# Altium footprint library mobinbyn-Module.PcbLib: 93 footprints (part 3 of 6)
Each footprint in its own frame and in the unit in brackets; x right, y up, seen from the top. Pads: shape width x height; smd on the part's side, far side on the other; paste and mask are expansions set on the pad; w line width, h text height; cw(c..) or ccw(c..) is an arc to the next point about the centre after c.
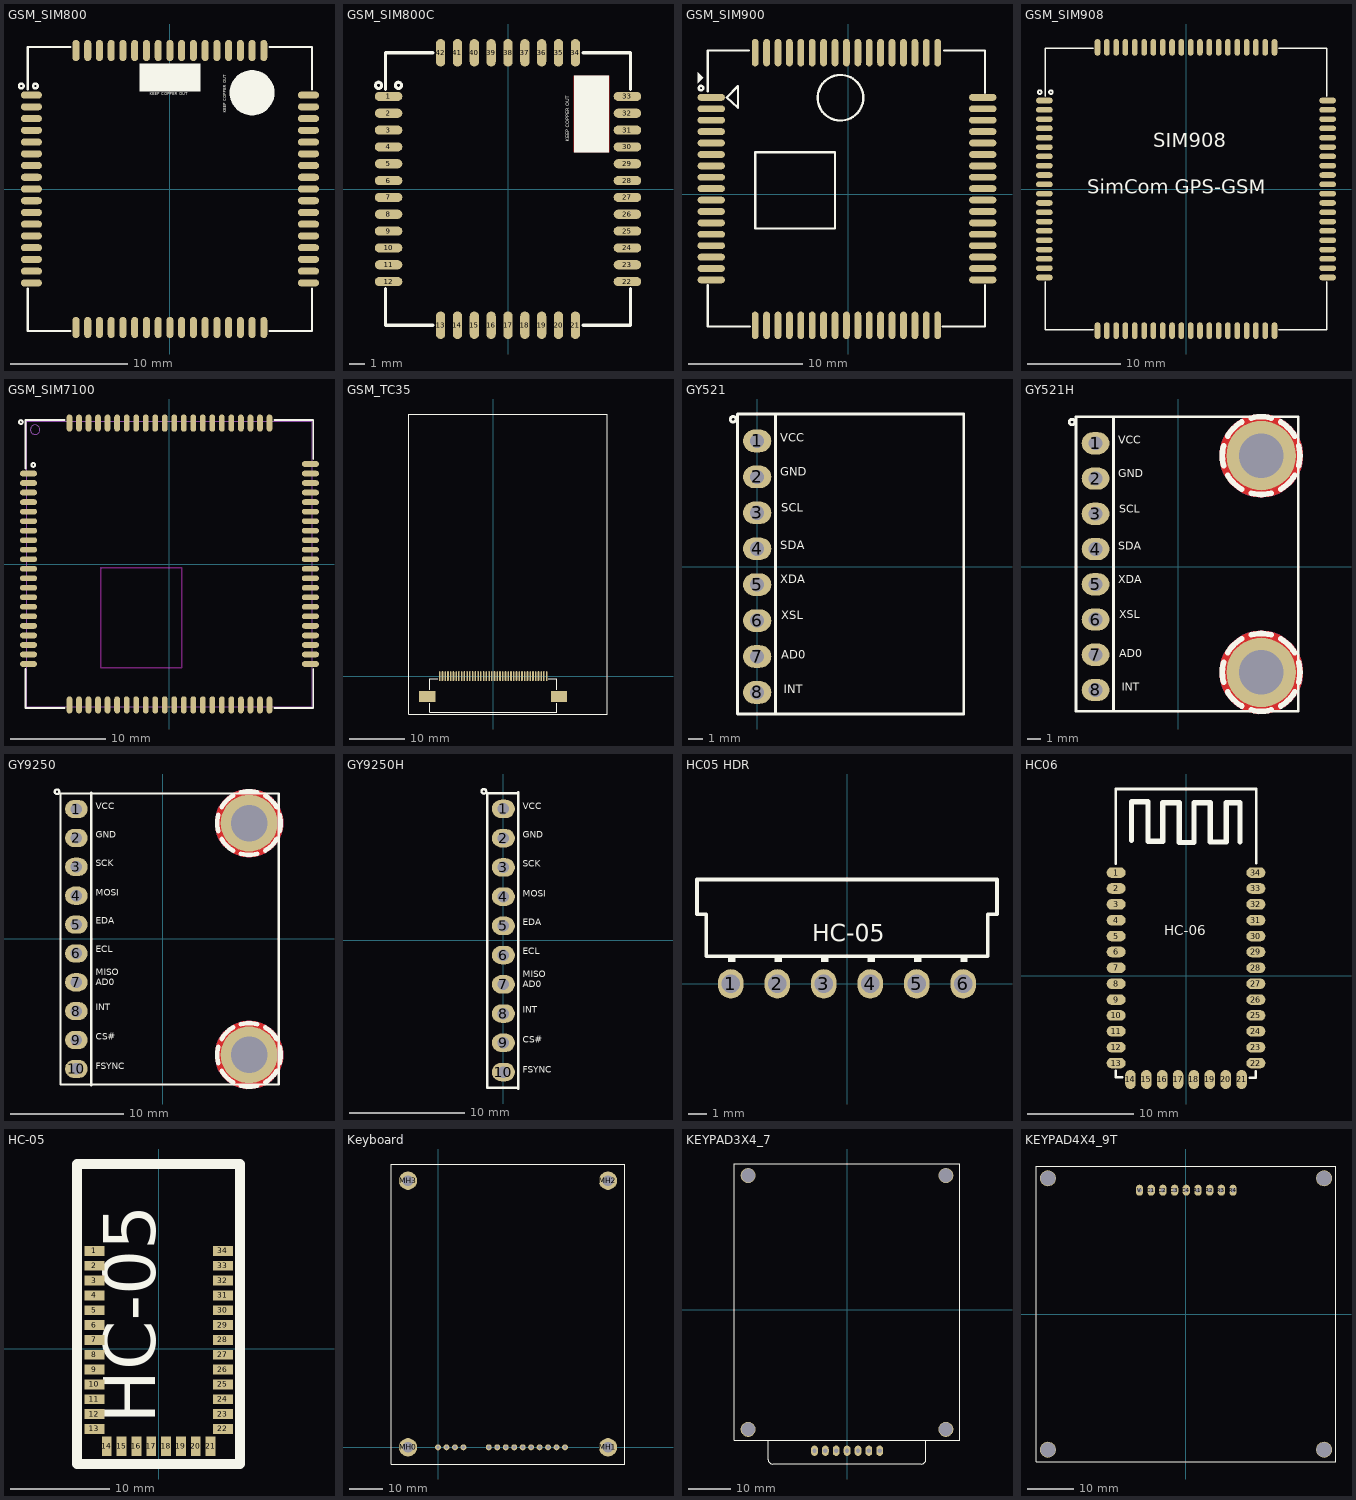
[diagram p2: the footprints below, top view; thin cyan lines are the x and y axes]

## GSM_SIM800 [mm]
pads (68):
  oval 1.8x0.6 smd: 1(-11.8,8) 2(-11.8,7) 3(-11.8,6) 4(-11.8,5) 5(-11.8,4) 6(-11.8,3) 7(-11.8,2) 8(-11.8,1) 9(-11.8,0) 10(-11.8,-1) 11(-11.8,-2) 12(-11.8,-3) 13(-11.8,-4) 14(-11.8,-5) 15(-11.8,-6) 16(-11.8,-7) 17(-11.8,-8) 35(11.8,-8) 36(11.8,-7) 37(11.8,-6) 38(11.8,-5) 39(11.8,-4) 40(11.8,-3) 41(11.8,-2) 42(11.8,-1) 43(11.8,0) 44(11.8,1) 45(11.8,2) 46(11.8,3) 47(11.8,4) 48(11.8,5) 49(11.8,6) 50(11.8,7) 51(11.8,8)
  oval 0.6x1.8 smd: 18(-8,-11.8) 19(-7,-11.8) 20(-6,-11.8) 21(-5,-11.8) 22(-4,-11.8) 23(-3,-11.8) 24(-2,-11.8) 25(-1,-11.8) 26(0,-11.8) 27(1,-11.8) 28(2,-11.8) 29(3,-11.8) 30(4,-11.8) 31(5,-11.8) 32(6,-11.8) 33(7,-11.8) 34(8,-11.8) 52(8,11.8) 53(7,11.8) 54(6,11.8) 55(5,11.8) 56(4,11.8) 57(3,11.8) 58(2,11.8) 59(1,11.8) 60(0,11.8) 61(-1,11.8) 62(-2,11.8) 63(-3,11.8) 64(-4,11.8) 65(-5,11.8) 66(-6,11.8) 67(-7,11.8) 68(-8,11.8)
Top Overlay:
  circle w0.2: c-11.455,8.774 r0.2
  circle w0.2: c-12.655,8.774 r0.2
  rectangle: -2.6,8.3 2.6,10.7
  region: 5.1,8.2 5.1,8.387 5.173,8.754 5.316,9.1 5.524,9.411 5.789,9.676 6.1,9.884 6.446,10.027 6.813,10.1 7,10.1 7.187,10.1 7.554,10.027 7.9,9.884 8.211,9.676 8.476,9.411 8.684,9.1 8.827,8.754 8.9,8.387 8.9,8.2 8.9,8.013 8.827,7.646 8.684,7.3 8.476,6.989 8.211,6.724 7.9,6.516 7.554,6.373 7.187,6.3 7,6.3 6.813,6.3 6.446,6.373 6.1,6.516 5.789,6.724 5.524,6.989 5.316,7.3 5.173,7.646 5.1,8.013
  lines w0.2: -12.1,-8.5 -12.1,-12.1 -8.5,-12.1 ; -12.1,8.5 -12.1,12.1 -8.5,12.1 ; 8.5,-12.1 12.1,-12.1 12.1,-8.5 ; 8.5,12.1 12.1,12.1 12.1,8.5
  text "KEEP COPPER OUT" at 4.9,6.5 h0.4
  text "KEEP COPPER OUT" at -1.7,7.9 h0.4
3D body "User Library-SIM800.step": height 3.1, standoff 0.1, extent -12,-12 12,12

## GSM_SIM800C [mm] "GSM, SIM800C, 42-L, 15.7X17.6mm"
pads (42):
  oval 1.8x0.6 smd: 1(-7.8,6.05) 2(-7.8,4.95) 3(-7.8,3.85) 4(-7.8,2.75) 5(-7.8,1.65) 6(-7.8,0.55) 7(-7.8,-0.55) 8(-7.8,-1.65) 9(-7.8,-2.75) 10(-7.8,-3.85) 11(-7.8,-4.95) 12(-7.8,-6.05) 22(7.8,-6.05) 23(7.8,-4.95) 24(7.8,-3.85) 25(7.8,-2.75) 26(7.8,-1.65) 27(7.8,-0.55) 28(7.8,0.55) 29(7.8,1.65) 30(7.8,2.75) 31(7.8,3.85) 32(7.8,4.95) 33(7.8,6.05)
  oval 0.6x1.8 smd: 13(-4.4,-8.9) 14(-3.3,-8.9) 15(-2.2,-8.9) 16(-1.1,-8.9) 17(0,-8.9) 18(1.1,-8.9) 19(2.2,-8.9) 20(3.3,-8.9) 21(4.4,-8.9) 34(4.4,8.9) 35(3.3,8.9) 36(2.2,8.9) 37(1.1,8.9) 38(0,8.9) 39(-1.1,8.9) 40(-2.2,8.9) 41(-3.3,8.9) 42(-4.4,8.9)
Top Layer:
  pour cut-out: 6.6,7.4 4.3,7.4 4.3,2.4 6.6,2.4
Top Overlay:
  circle w0.2: c-7.155,6.774 r0.2
  circle w0.2: c-8.455,6.774 r0.2
  rectangle: 4.3,2.4 6.6,7.4
  lines w0.2: -8,-6.5 -8,-8.9 -4.9,-8.9 ; -8,6.5 -8,8.9 -4.9,8.9 ; 4.9,-8.9 8,-8.9 8,-6.5 ; 4.9,8.9 8,8.9 8,6.5
  text "KEEP COPPER OUT" at 4.1,3.1 h0.4
3D body "SIM800C-1.STEP": height 2.37, standoff 0.03, extent -7.849,-8.812 7.851,8.788

## GSM_SIM900 [mm] "SIM900_SIM900A"
pads (68):
  oval 2.4x0.6 smd mask+0.1: 1(-12,8.48) 2(-12,7.48) 3(-12,6.48) 4(-12,5.48) 5(-12,4.48) 6(-12,3.48) 7(-12,2.48) 8(-12,1.48) 9(-12,0.48) 10(-12,-0.52) 11(-12,-1.52) 12(-12,-2.52) 13(-12,-3.52) 14(-12,-4.52) 15(-12,-5.52) 16(-12,-6.52) 17(-12,-7.52) 35(11.8,-7.52) 36(11.8,-6.52) 37(11.8,-5.52) 38(11.8,-4.52) 39(11.8,-3.52) 40(11.8,-2.52) 41(11.8,-1.52) 42(11.8,-0.52) 43(11.8,0.48) 44(11.8,1.48) 45(11.8,2.48) 46(11.8,3.48) 47(11.8,4.48) 48(11.8,5.48) 49(11.8,6.48) 50(11.8,7.48) 51(11.8,8.48)
  oval 0.6x2.4 smd mask+0.1: 18(-8.15,-11.5) 19(-7.15,-11.5) 20(-6.15,-11.5) 21(-5.15,-11.5) 22(-4.15,-11.5) 23(-3.15,-11.5) 24(-2.15,-11.5) 25(-1.15,-11.5) 26(-0.15,-11.5) 27(0.85,-11.5) 28(1.85,-11.5) 29(2.85,-11.5) 30(3.85,-11.5) 31(4.85,-11.5) 32(5.85,-11.5) 33(6.85,-11.5) 34(7.85,-11.5) 52(7.85,12.4) 53(6.85,12.4) 54(5.85,12.4) 55(4.85,12.4) 56(3.85,12.4) 57(2.85,12.4) 58(1.85,12.4) 59(0.85,12.4) 60(-0.15,12.4) 61(-1.15,12.4) 62(-2.15,12.4) 63(-3.15,12.4) 64(-4.15,12.4) 65(-5.15,12.4) 66(-6.15,12.4) 67(-7.15,12.4) 68(-8.15,12.4)
Top Overlay:
  circle w0.2: c-12.9,9.3 r0.2
  circle w0.2: c-0.67,8.45 r2
  region: -13.2,9.7 -13.2,10.7 -12.7,10.2
  lines w0.2: -12.3,-8 -12.3,-11.6 -8.6,-11.6 ; -12.3,9 -12.3,12.6 -8.7,12.6 ; 8.3,-11.6 12,-11.6 12,-8 ; 8.4,12.6 12,12.6 12,8.9 ; -10.65,8.48 -9.65,9.48 -9.65,7.58 -10.65,8.48 ; -8.15,-3.02 -1.15,-3.02 -1.15,3.68 -8.15,3.68 -8.15,-3.02
3D body "GSM_SIM900.STEP": height 3, standoff 0, extent -12.15,-11.5 11.85,12.5

## GSM_SIM908 [mm] "SimCom Sim908 GPS/GSM"
pads (80):
  oval 1.8x0.6 smd: 1(-15.2,9.5) 2(-15.2,8.5) 3(-15.2,7.5) 4(-15.2,6.5) 5(-15.2,5.5) 6(-15.2,4.5) 7(-15.2,3.5) 8(-15.2,2.5) 9(-15.2,1.5) 10(-15.2,0.5) 11(-15.2,-0.5) 12(-15.2,-1.5) 13(-15.2,-2.5) 14(-15.2,-3.5) 15(-15.2,-4.5) 16(-15.2,-5.5) 17(-15.2,-6.5) 18(-15.2,-7.5) 19(-15.2,-8.5) 20(-15.2,-9.5) 41(15.2,-9.5) 42(15.2,-8.5) 43(15.2,-7.5) 44(15.2,-6.5) 45(15.2,-5.5) 46(15.2,-4.5) 47(15.2,-3.5) 48(15.2,-2.5) 49(15.2,-1.5) 50(15.2,-0.5) 51(15.2,0.5) 52(15.2,1.5) 53(15.2,2.5) 54(15.2,3.5) 55(15.2,4.5) 56(15.2,5.5) 57(15.2,6.5) 58(15.2,7.5) 59(15.2,8.5) 60(15.2,9.5)
  oval 0.6x1.8 smd: 21(-9.5,-15.2) 22(-8.5,-15.2) 23(-7.5,-15.2) 24(-6.5,-15.2) 25(-5.5,-15.2) 26(-4.5,-15.2) 27(-3.5,-15.2) 28(-2.5,-15.2) 29(-1.5,-15.2) 30(-0.5,-15.2) 31(0.5,-15.2) 32(1.5,-15.2) 33(2.5,-15.2) 34(3.5,-15.2) 35(4.5,-15.2) 36(5.5,-15.2) 37(6.5,-15.2) 38(7.5,-15.2) 39(8.5,-15.2) 40(9.5,-15.2) 61(9.5,15.2) 62(8.5,15.2) 63(7.5,15.2) 64(6.5,15.2) 65(5.5,15.2) 66(4.5,15.2) 67(3.5,15.2) 68(2.5,15.2) 69(1.5,15.2) 70(0.5,15.2) 71(-0.5,15.2) 72(-1.5,15.2) 73(-2.5,15.2) 74(-3.5,15.2) 75(-4.5,15.2) 76(-5.5,15.2) 77(-6.5,15.2) 78(-7.5,15.2) 79(-8.5,15.2) 80(-9.5,15.2)
Top Overlay:
  circle w0.2: c-15.7,10.4 r0.2
  circle w0.2: c-14.5,10.4 r0.2
  lines w0.2: -15.1,-10 -15.1,-15.1 -10,-15.1 ; -15.1,10 -15.1,15.1 -10,15.1 ; 10,-15.1 15.1,-15.1 15.1,-10 ; 10,15.1 15.1,15.1 15.1,10
  text "SIM908" at -3.5,4.5 h1.52
  text "SimCom GPS-GSM" at -10.576,-0.5 h1.52
3D body "User Library-SIM908.STEP": height 3.39, standoff 0.19, extent -15,-15 15,15

## GSM_SIM7100 [mm] "SIM7100 SIM5360 87-lead pitch:1mm 30x30mm"
height 2.9
pads (87):
  oval 1.8x0.6 smd mask+0.075: 1(-14.8,9.5) 2(-14.8,8.5) 3(-14.8,7.5) 4(-14.8,6.5) 5(-14.8,5.5) 6(-14.8,4.5) 7(-14.8,3.5) 8(-14.8,2.5) 9(-14.8,1.5) 10(-14.8,0.5) 11(-14.8,-0.5) 12(-14.8,-1.5) 13(-14.8,-2.5) 14(-14.8,-3.5) 15(-14.8,-4.5) 16(-14.8,-5.5) 17(-14.8,-6.5) 18(-14.8,-7.5) 19(-14.8,-8.5) 20(-14.8,-9.5) 41(14.8,-9.5) 42(14.8,-8.5) 43(14.8,-7.5) 44(14.8,-6.5) 45(14.8,-5.5) 46(14.8,-4.5) 47(14.8,-3.5) 48(14.8,-2.5) 49(14.8,-1.5) 50(14.8,-0.5) 51(14.8,0.5) 52(14.8,1.5) 53(14.8,2.5) 54(14.8,3.5) 55(14.8,4.5) 56(14.8,5.5) 57(14.8,6.5) 58(14.8,7.5) 59(14.8,8.5) 60(14.8,9.5) 81(-14.8,-10.5) 82(14.8,-10.5) 85(14.8,10.5)
  oval 0.6x1.8 smd mask+0.075: 21(-9.5,-14.8) 22(-8.5,-14.8) 23(-7.5,-14.8) 24(-6.5,-14.8) 25(-5.5,-14.8) 26(-4.5,-14.8) 27(-3.5,-14.8) 28(-2.5,-14.8) 29(-1.5,-14.8) 30(-0.5,-14.8) 31(0.5,-14.8) 32(1.5,-14.8) 33(2.5,-14.8) 34(3.5,-14.8) 35(4.5,-14.8) 36(5.5,-14.8) 37(6.5,-14.8) 38(7.5,-14.8) 39(8.5,-14.8) 40(9.5,-14.8) 61(9.5,14.8) 62(8.5,14.8) 63(7.5,14.8) 64(6.5,14.8) 65(5.5,14.8) 66(4.5,14.8) 67(3.5,14.8) 68(2.5,14.8) 69(1.5,14.8) 70(0.5,14.8) 71(-0.5,14.8) 72(-1.5,14.8) 73(-2.5,14.8) 74(-3.5,14.8) 75(-4.5,14.8) 76(-5.5,14.8) 77(-6.5,14.8) 78(-7.5,14.8) 79(-8.5,14.8) 80(-9.5,14.8) 83(10.5,-14.8) 84(-10.5,-14.8) 86(-10.5,14.8) 87(10.5,14.8)
Top Overlay:
  circle w0.2: c-15.6,14.9 r0.2
  circle w0.2: c-14.3,10.4 r0.2
  lines w0.2: -15.1,-11 -15.1,-15.1 -11,-15.1 ; -15.1,10 -15.1,15.1 -11,15.1 ; 11,-15.1 15.1,-15.1 15.1,-11 ; 11,15.1 15.1,15.1 15.1,11
Keep-Out Layer:
  lines w0.15: -7.2,-10.9 1.3,-10.9 1.3,-0.4 -7.2,-0.4 -7.2,-10.9
Mechanical 13:
  circle w0.1: c-14.1,14.1 r0.5
  lines w0.1: -15,-15 15,-15 15,15 -15,15 -15,-15
3D body "User Library-SIM7100C.step": height 3.17, standoff 0, extent -15,-15 15,15

## GSM_TC35 [mm]
pads (42):
  oval 0.3x1.8 smd mask+0.05: 1(9.75,0) 2(9.25,0) 3(8.75,0) 4(8.25,0) 5(7.75,0) 6(7.25,0) 7(6.75,0) 8(6.25,0) 9(5.75,0) 10(5.25,0) 11(4.75,0) 12(4.25,0) 13(3.75,0) 14(3.25,0) 15(2.75,0) 16(2.25,0) 17(1.75,0) 18(1.25,0) 19(0.75,0) 20(0.25,0) 21(-0.25,0) 22(-0.75,0) 23(-1.25,0) 24(-1.75,0) 25(-2.25,0) 26(-2.75,0) 27(-3.25,0) 28(-3.75,0) 29(-4.25,0) 30(-4.75,0) 31(-5.25,0) 32(-5.75,0) 33(-6.25,0) 34(-6.75,0) 35(-7.25,0) 36(-7.75,0) 37(-8.25,0) 38(-8.75,0) 39(-9.25,0) 40(-9.75,0)
  rrect0% 3x2 smd: ""(-12,-3.7) ""(12,-3.7)
Top Overlay:
  lines w0.2: -11.6,-4.9 -11.6,-6.6 11.55,-6.6 ; -11.6,-2.5 -11.6,-0.5 -10.074,-0.5 ; 10.074,-0.5 11.6,-0.5 11.6,-2.5 ; 11.6,-6.6 11.6,-4.9 ; -15.4,-6.9 20.8,-6.9 20.8,47.8 -15.4,47.8 -15.4,-6.9
3D body: height 3, standoff 0.1, extent -11.5,-6.6 11.55,-0.6
3D body "User Library-siemens tc35i module.STEP": height 5.55, standoff 2, extent -15.264,-6.772 20.736,47.728

## GY521 [mm] "GY-521, MPU-6050 Module"
pads (8):
  oval 2x1.6 hole 1 mask+0.1: 1(0,8.89) 2(0,6.35) 3(0,3.81) 4(0,1.27) 5(0,-1.27) 6(0,-3.81) 7(0,-6.35) 8(0,-8.89)
Top Overlay:
  circle w0.2: c-1.7,10.42 r0.2
  lines w0.2: 1.3,-10.414 1.3,10.795 ; -1.4,-10.414 14.605,-10.414 14.605,10.795 -1.4,10.795 -1.4,-10.414
  text "VCC" at 1.651,8.636 h1
  text "SCL" at 1.706,3.683 h1
  text "SDA" at 1.645,1.016 h1
  text "XDA" at 1.63,-1.397 h1
  text "XSL" at 1.715,-3.937 h1
  text "AD0" at 1.7,-6.731 h1
  text "INT" at 1.891,-9.144 h1
  text "GND" at 1.622,6.223 h1
3D body "MPU-6050 IMU-GY-521.STEP": height 8.94, standoff -2.23, extent -1.27,-10.367 14.605,10.741

## GY521H [mm] "GY-521, MPU-6050 Module"
pads (10):
  oval 2x1.6 hole 1 mask+0.1: 1(-5.969,8.89) 2(-5.969,6.35) 3(-5.969,3.81) 4(-5.969,1.27) 5(-5.969,-1.27) 6(-5.969,-3.81) 7(-5.969,-6.35) 8(-5.969,-8.89)
  round 5 / inner round 3.5 / far side round 5 hole 3.2 mask+0.1: ""(5.969,-7.62) ""(5.969,8.001)
Top Layer:
  pour cut-out: 5.969,11.001 5.772,11.001 5.382,10.95 5.003,10.848 4.639,10.697 4.299,10.501 3.987,10.261 3.709,9.983 3.469,9.671 3.273,9.331 3.122,8.967 3.02,8.588 2.969,8.198 2.969,8.001 2.969,7.804 3.02,7.414 3.122,7.035 3.273,6.671 3.469,6.331 3.709,6.019 3.987,5.741 4.299,5.501 4.639,5.305 5.003,5.154 5.382,5.052 5.772,5.001 5.969,5.001 6.166,5.001 6.556,5.052 6.935,5.154 7.299,5.305 7.639,5.501 7.951,5.741 8.229,6.019 8.469,6.331 8.665,6.671 8.816,7.035 8.918,7.414 8.969,7.804 8.969,8.001 8.969,8.198 8.918,8.588 8.816,8.967 8.665,9.331 8.469,9.671 8.229,9.983 7.951,10.261 7.639,10.501 7.299,10.697 6.935,10.848 6.556,10.95 6.166,11.001
  pour cut-out: 5.969,-4.62 5.772,-4.62 5.382,-4.671 5.003,-4.773 4.639,-4.924 4.299,-5.12 3.987,-5.36 3.709,-5.638 3.469,-5.95 3.273,-6.29 3.122,-6.654 3.02,-7.033 2.969,-7.423 2.969,-7.62 2.969,-7.817 3.02,-8.207 3.122,-8.586 3.273,-8.95 3.469,-9.29 3.709,-9.602 3.987,-9.88 4.299,-10.12 4.639,-10.316 5.003,-10.467 5.382,-10.569 5.772,-10.62 5.969,-10.62 6.166,-10.62 6.556,-10.569 6.935,-10.467 7.299,-10.316 7.639,-10.12 7.951,-9.88 8.229,-9.602 8.469,-9.29 8.665,-8.95 8.816,-8.586 8.918,-8.207 8.969,-7.817 8.969,-7.62 8.969,-7.423 8.918,-7.033 8.816,-6.654 8.665,-6.29 8.469,-5.95 8.229,-5.638 7.951,-5.36 7.639,-5.12 7.299,-4.924 6.935,-4.773 6.556,-4.671 6.166,-4.62
Bottom Layer:
  pour cut-out: 5.969,11.001 5.772,11.001 5.382,10.95 5.003,10.848 4.639,10.697 4.299,10.501 3.987,10.261 3.709,9.983 3.469,9.671 3.273,9.331 3.122,8.967 3.02,8.588 2.969,8.198 2.969,8.001 2.969,7.804 3.02,7.414 3.122,7.035 3.273,6.671 3.469,6.331 3.709,6.019 3.987,5.741 4.299,5.501 4.639,5.305 5.003,5.154 5.382,5.052 5.772,5.001 5.969,5.001 6.166,5.001 6.556,5.052 6.935,5.154 7.299,5.305 7.639,5.501 7.951,5.741 8.229,6.019 8.469,6.331 8.665,6.671 8.816,7.035 8.918,7.414 8.969,7.804 8.969,8.001 8.969,8.198 8.918,8.588 8.816,8.967 8.665,9.331 8.469,9.671 8.229,9.983 7.951,10.261 7.639,10.501 7.299,10.697 6.935,10.848 6.556,10.95 6.166,11.001
  pour cut-out: 5.969,-4.62 5.772,-4.62 5.382,-4.671 5.003,-4.773 4.639,-4.924 4.299,-5.12 3.987,-5.36 3.709,-5.638 3.469,-5.95 3.273,-6.29 3.122,-6.654 3.02,-7.033 2.969,-7.423 2.969,-7.62 2.969,-7.817 3.02,-8.207 3.122,-8.586 3.273,-8.95 3.469,-9.29 3.709,-9.602 3.987,-9.88 4.299,-10.12 4.639,-10.316 5.003,-10.467 5.382,-10.569 5.772,-10.62 5.969,-10.62 6.166,-10.62 6.556,-10.569 6.935,-10.467 7.299,-10.316 7.639,-10.12 7.951,-9.88 8.229,-9.602 8.469,-9.29 8.665,-8.95 8.816,-8.586 8.918,-8.207 8.969,-7.817 8.969,-7.62 8.969,-7.423 8.918,-7.033 8.816,-6.654 8.665,-6.29 8.469,-5.95 8.229,-5.638 7.951,-5.36 7.639,-5.12 7.299,-4.924 6.935,-4.773 6.556,-4.671 6.166,-4.62
Top Overlay:
  circle w0.2: c-7.669,10.42 r0.2
  lines w0.2: -4.669,-10.414 -4.669,10.795 ; -7.369,-10.414 8.636,-10.414 8.636,10.795 -7.369,10.795 -7.369,-10.414
  lines w0.4: 3.264,-8.345 cw(c5.969,-7.62) 3.264,-6.895 ; 3.264,7.276 cw(c5.969,8.001) 3.264,8.726 ; 3.544,-9.02 ccw(c5.969,-7.62) 4.569,-10.045 ; 3.544,-6.22 cw(c5.969,-7.62) 4.569,-5.195 ; 3.544,6.601 ccw(c5.969,8.001) 4.569,5.576 ; 3.544,9.401 cw(c5.969,8.001) 4.569,10.426 ; 5.244,-10.325 ccw(c5.969,-7.62) 6.694,-10.325 ; 5.244,-4.915 cw(c5.969,-7.62) 6.694,-4.915 ; 5.244,5.296 ccw(c5.969,8.001) 6.694,5.296 ; 5.244,10.706 cw(c5.969,8.001) 6.694,10.706 ; 7.369,-10.045 ccw(c5.969,-7.62) 8.394,-9.02 ; 7.369,-5.195 cw(c5.969,-7.62) 8.394,-6.22 ; 7.369,5.576 ccw(c5.969,8.001) 8.394,6.601 ; 7.369,10.426 cw(c5.969,8.001) 8.394,9.401 ; 8.674,-8.345 ccw(c5.969,-7.62) 8.674,-6.895 ; 8.674,7.276 ccw(c5.969,8.001) 8.674,8.726
  text "VCC" at -4.318,8.636 h1
  text "SCL" at -4.263,3.683 h1
  text "SDA" at -4.324,1.016 h1
  text "XDA" at -4.339,-1.397 h1
  text "XSL" at -4.254,-3.937 h1
  text "AD0" at -4.269,-6.731 h1
  text "INT" at -4.078,-9.144 h1
  text "GND" at -4.347,6.223 h1
3D body "MPU-6050 IMU-GY-521.STEP": height 8.94, standoff -2.23, extent -7.239,-10.367 8.636,10.741

## GY9250 [mm] "GY-9250, MPU-9250 Module"
pads (12):
  oval 2x1.6 hole 1 mask+0.1: 1(-7.6,11.43) 2(-7.6,8.89) 3(-7.6,6.35) 4(-7.6,3.81) 5(-7.6,1.27) 6(-7.6,-1.27) 7(-7.6,-3.81) 8(-7.6,-6.35) 9(-7.6,-8.89) 10(-7.6,-11.43)
  round 5 / inner round 3.5 / far side round 5 hole 3.2 mask+0.1: ""(7.6,-10.2) ""(7.6,10.2)
Top Layer:
  pour cut-out: 4.6,-10.2 4.6,-10.397 4.651,-10.787 4.753,-11.166 4.904,-11.53 5.1,-11.87 5.34,-12.182 5.618,-12.46 5.93,-12.7 6.27,-12.896 6.634,-13.047 7.013,-13.149 7.403,-13.2 7.6,-13.2 7.797,-13.2 8.187,-13.149 8.566,-13.047 8.93,-12.896 9.27,-12.7 9.582,-12.46 9.86,-12.182 10.1,-11.87 10.296,-11.53 10.447,-11.166 10.549,-10.787 10.6,-10.397 10.6,-10.2 10.6,-10.003 10.549,-9.613 10.447,-9.234 10.296,-8.87 10.1,-8.53 9.86,-8.218 9.582,-7.94 9.27,-7.7 8.93,-7.504 8.566,-7.353 8.187,-7.251 7.797,-7.2 7.6,-7.2 7.403,-7.2 7.013,-7.251 6.634,-7.353 6.27,-7.504 5.93,-7.7 5.618,-7.94 5.34,-8.218 5.1,-8.53 4.904,-8.87 4.753,-9.234 4.651,-9.613 4.6,-10.003
  pour cut-out: 7.6,13.2 7.403,13.2 7.013,13.149 6.634,13.047 6.27,12.896 5.93,12.7 5.618,12.46 5.34,12.182 5.1,11.87 4.904,11.53 4.753,11.166 4.651,10.787 4.6,10.397 4.6,10.2 4.6,10.003 4.651,9.613 4.753,9.234 4.904,8.87 5.1,8.53 5.34,8.218 5.618,7.94 5.93,7.7 6.27,7.504 6.634,7.353 7.013,7.251 7.403,7.2 7.6,7.2 7.797,7.2 8.187,7.251 8.566,7.353 8.93,7.504 9.27,7.7 9.582,7.94 9.86,8.218 10.1,8.53 10.296,8.87 10.447,9.234 10.549,9.613 10.6,10.003 10.6,10.2 10.6,10.397 10.549,10.787 10.447,11.166 10.296,11.53 10.1,11.87 9.86,12.182 9.582,12.46 9.27,12.7 8.93,12.896 8.566,13.047 8.187,13.149 7.797,13.2
Bottom Layer:
  pour cut-out: 4.6,-10.2 4.6,-10.397 4.651,-10.787 4.753,-11.166 4.904,-11.53 5.1,-11.87 5.34,-12.182 5.618,-12.46 5.93,-12.7 6.27,-12.896 6.634,-13.047 7.013,-13.149 7.403,-13.2 7.6,-13.2 7.797,-13.2 8.187,-13.149 8.566,-13.047 8.93,-12.896 9.27,-12.7 9.582,-12.46 9.86,-12.182 10.1,-11.87 10.296,-11.53 10.447,-11.166 10.549,-10.787 10.6,-10.397 10.6,-10.2 10.6,-10.003 10.549,-9.613 10.447,-9.234 10.296,-8.87 10.1,-8.53 9.86,-8.218 9.582,-7.94 9.27,-7.7 8.93,-7.504 8.566,-7.353 8.187,-7.251 7.797,-7.2 7.6,-7.2 7.403,-7.2 7.013,-7.251 6.634,-7.353 6.27,-7.504 5.93,-7.7 5.618,-7.94 5.34,-8.218 5.1,-8.53 4.904,-8.87 4.753,-9.234 4.651,-9.613 4.6,-10.003
  pour cut-out: 7.6,13.2 7.403,13.2 7.013,13.149 6.634,13.047 6.27,12.896 5.93,12.7 5.618,12.46 5.34,12.182 5.1,11.87 4.904,11.53 4.753,11.166 4.651,10.787 4.6,10.397 4.6,10.2 4.6,10.003 4.651,9.613 4.753,9.234 4.904,8.87 5.1,8.53 5.34,8.218 5.618,7.94 5.93,7.7 6.27,7.504 6.634,7.353 7.013,7.251 7.403,7.2 7.6,7.2 7.797,7.2 8.187,7.251 8.566,7.353 8.93,7.504 9.27,7.7 9.582,7.94 9.86,8.218 10.1,8.53 10.296,8.87 10.447,9.234 10.549,9.613 10.6,10.003 10.6,10.2 10.6,10.397 10.549,10.787 10.447,11.166 10.296,11.53 10.1,11.87 9.86,12.182 9.582,12.46 9.27,12.7 8.93,12.896 8.566,13.047 8.187,13.149 7.797,13.2
Top Overlay:
  circle w0.2: c-9.3,12.96 r0.2
  lines w0.2: -6.3,-12.9 -6.3,12.9 ; -9,-12.8 10.2,-12.8 10.2,12.8 -9,12.8 -9,-12.8
  lines w0.4: 4.895,-10.925 cw(c7.6,-10.2) 4.895,-9.475 ; 4.895,9.475 cw(c7.6,10.2) 4.895,10.925 ; 5.175,-11.6 ccw(c7.6,-10.2) 6.2,-12.625 ; 5.175,-8.8 cw(c7.6,-10.2) 6.2,-7.775 ; 5.175,8.8 ccw(c7.6,10.2) 6.2,7.775 ; 5.175,11.6 cw(c7.6,10.2) 6.2,12.625 ; 6.875,-12.905 ccw(c7.6,-10.2) 8.325,-12.905 ; 6.875,-7.495 cw(c7.6,-10.2) 8.325,-7.495 ; 6.875,7.495 ccw(c7.6,10.2) 8.325,7.495 ; 6.875,12.905 cw(c7.6,10.2) 8.325,12.905 ; 9,-12.625 ccw(c7.6,-10.2) 10.025,-11.6 ; 9,-7.775 cw(c7.6,-10.2) 10.025,-8.8 ; 9,7.775 ccw(c7.6,10.2) 10.025,8.8 ; 9,12.625 cw(c7.6,10.2) 10.025,11.6 ; 10.305,-10.925 ccw(c7.6,-10.2) 10.305,-9.475 ; 10.305,9.475 ccw(c7.6,10.2) 10.305,10.925
  text "FSYNC" at -5.9,-11.7 h1
  text "CS#" at -5.9,-9.1 h1
  text "INT" at -5.9,-6.5 h1
  text "AD0" at -5.9,-4.3 h1
  text "ECL" at -5.9,-1.4 h1
  text "EDA" at -5.9,1.1 h1
  text "MOSI" at -5.9,3.6 h1
  text "SCK" at -5.9,6.2 h1
  text "GND" at -5.9,8.7 h1
  text "VCC" at -5.9,11.2 h1
  text "MISO" at -5.9,-3.4 h1
3D body "MPU-9250.step": height 9.2, standoff -2.73, extent -8.9,-12.7 10.1,12.7

## GY9250H [mm] "GY-9250, MPU-9250 Module"
pads (10):
  oval 2x1.6 hole 1 mask+0.1: 1(0,11.43) 2(0,8.89) 3(0,6.35) 4(0,3.81) 5(0,1.27) 6(0,-1.27) 7(0,-3.81) 8(0,-6.35) 9(0,-8.89) 10(0,-11.43)
Top Overlay:
  circle w0.2: c-1.7,12.96 r0.2
  lines w0.2: 1.3,-12.9 1.3,12.9 ; 1.3,-12.8 -1.4,-12.8 -1.4,12.8 1.3,12.8
  text "MISO" at 1.7,-3.4 h1
  text "VCC" at 1.7,11.2 h1
  text "GND" at 1.7,8.7 h1
  text "SCK" at 1.7,6.2 h1
  text "MOSI" at 1.7,3.6 h1
  text "EDA" at 1.7,1.1 h1
  text "ECL" at 1.7,-1.4 h1
  text "AD0" at 1.7,-4.3 h1
  text "INT" at 1.7,-6.5 h1
  text "CS#" at 1.7,-9.1 h1
  text "FSYNC" at 1.7,-11.7 h1
3D body "MPU-9250.step": height 14.2, standoff 2.27, extent -1.3,-12.7 17.7,12.7

## HC05 HDR [mm] "Bluetooth HC-05"
pads (6):
  oval 1.4x1.6 / inner round 1.4 / far side oval 1.4x2.2 hole 1: 1(-6.35,0) 2(-3.81,0) 3(-1.27,0) 4(1.27,0) 5(3.81,0) 6(6.35,0)
Top Overlay:
  rectangle: 6.2,1.2 6.6,1.5
  rectangle: 3.66,1.2 4.06,1.5
  rectangle: 1.12,1.2 1.52,1.5
  rectangle: -1.42,1.2 -1.02,1.5
  rectangle: -3.96,1.2 -3.56,1.5
  rectangle: -6.5,1.2 -6.1,1.5
  lines w0.2: -8.2,3.8 -8.2,5.7 8.2,5.7 8.2,3.8 7.7,3.8 7.7,1.5 -7.7,1.5 -7.7,3.8 -8.2,3.8
  text "HC-05" at -1.9,2 h1.6
3D body "User Library-hc05.step": height 38, standoff -4.6, extent -8.05,-0.4 8.05,5.5

## HC06 [mm] "Bluetooth HC-06"
pads (34):
  oval 1.8x1 smd: 1(-6.6,9.75) 2(-6.6,8.25) 3(-6.6,6.75) 4(-6.6,5.25) 5(-6.6,3.75) 6(-6.6,2.25) 7(-6.6,0.75) 8(-6.6,-0.75) 9(-6.6,-2.25) 10(-6.6,-3.75) 11(-6.6,-5.25) 12(-6.6,-6.75) 13(-6.6,-8.25) 22(6.6,-8.25) 23(6.6,-6.75) 24(6.6,-5.25) 25(6.6,-3.75) 26(6.6,-2.25) 27(6.6,-0.75) 28(6.6,0.75) 29(6.6,2.25) 30(6.6,3.75) 31(6.6,5.25) 32(6.6,6.75) 33(6.6,8.25) 34(6.6,9.75)
  oval 1x1.8 smd: 14(-5.25,-9.8) 15(-3.75,-9.8) 16(-2.25,-9.8) 17(-0.75,-9.8) 18(0.75,-9.8) 19(2.25,-9.8) 20(3.75,-9.8) 21(5.25,-9.8)
Top Overlay:
  lines w0.25: -6.65,-9 -6.65,-9.6 -6.05,-9.6 ; -6.65,10.6 -6.65,17.65 6.65,17.65 6.65,10.65 ; 6.05,-9.65 6.6,-9.65 6.6,-9.05
  lines w0.5: -5.15,12.8 -5.15,16.45 -3.6,16.45 -3.6,12.7 -2.2,12.7 -2.2,16.35 -0.65,16.35 -0.65,12.6 0.75,12.6 0.75,16.35 2.3,16.35 2.3,12.65 3.8,12.65 3.8,16.35 5.1,16.35 5.1,12.65
  text "HC-06" at -2.05,3.5 h1.6
3D body "BLUETOOTH-HC-06 Package.STEP": height 4.3, standoff 0, extent -6.5,-9.5 6.5,17.5

## HC-05 [mm]
pads (34):
  rect 2x1 smd: 1(-6.5,9.875) 2(-6.5,8.375) 3(-6.5,6.875) 4(-6.5,5.375) 5(-6.5,3.875) 6(-6.5,2.375) 7(-6.5,0.875) 8(-6.5,-0.625) 9(-6.5,-2.125) 10(-6.5,-3.625) 11(-6.5,-5.125) 12(-6.5,-6.625) 13(-6.5,-8.125) 22(6.5,-8.125) 23(6.5,-6.625) 24(6.5,-5.125) 25(6.5,-3.625) 26(6.5,-2.125) 27(6.5,-0.625) 28(6.5,0.875) 29(6.5,2.375) 30(6.5,3.875) 31(6.5,5.375) 32(6.5,6.875) 33(6.5,8.375) 34(6.5,9.875)
  rect 1x2 smd: 14(-5.25,-9.875) 15(-3.75,-9.875) 16(-2.25,-9.875) 17(-0.75,-9.875) 18(0.75,-9.875) 19(2.25,-9.875) 20(3.75,-9.875) 21(5.25,-9.875)
Top Overlay:
  lines w1: -8.278,-11.681 -8.278,18.672 8.232,18.672 8.232,-11.681 -8.278,-11.681
  text "HC-05" at 1.374,-7.617 h9
3D body "Bluetooth HC-06_.step": height 2.35, standoff 0, extent -7.008,-9.903 7.012,18.107

## Keyboard [mil] "Matrix Keyboard 4x4"
pads (18):
  round 70 hole 40: 1(0,0) 2(100,0) 3(200,0) 4(300,0) 5(700,0) 6(800,0) 7(900,0) 8(1000,0) 9(600,0) 10(1100,0) 11(1200,0) 12(1300,0) 13(1400,0) 14(1500,0)
  round 216.54 hole 125.98: MH0(-354.33,0) MH1(2007.87,0) MH2(2007.87,3149.61) MH3(-354.33,3149.61)
Top Overlay:
  lines w10: -551.18,-196.85 2204.72,-196.85 2204.72,3346.46 -551.18,3346.46 -551.18,-196.85
3D body "Keyboard.STEP": height 874.82, standoff 590.55, extent -551.18,-196.85 2204.73,3346.46
3D body "Spacer.STEP": height 590.55, standoff -196.85, extent 1895.36,3052.17 2120.39,3247.05
3D body "Spacer.STEP": height 590.55, standoff -196.85, extent 1895.36,-97.44 2120.39,97.44
3D body "Spacer.STEP": height 590.55, standoff -196.85, extent -466.84,-97.44 -241.81,97.44
3D body "Spacer.STEP": height 590.55, standoff -196.85, extent -466.85,3052.16 -241.82,3247.05
3D body "header10-15mm.STEP": height 710, standoff -100, extent 550,-50 1550,50
3D body "header04-15mm.STEP": height 710, standoff -100, extent -50,-50 350,50

## KEYPAD3X4_7 [mm] "Matrix Keyboard 4x4"
pads (11):
  oval 1.6x2.4 hole 1: C1(-7.6,-32.9) C2(-5.06,-32.9) C3(-2.52,-32.9) R1(0.02,-32.9) R2(2.56,-32.9) R3(5.1,-32.9) R4(7.64,-32.9)
  round 3.5 / inner round 3.5 / far side round 5.5 hole 3.2: ""(-23.1,-27.9) ""(-23.1,31.4) ""(23.1,-27.9) ""(23.1,31.4)
Top Overlay:
  lines w0.2: -18.4,-30.4 -18.4,-35 ccw(c-17.4,-35) -17.4,-36 17.4,-36 ccw(c17.4,-35) 18.4,-35 18.4,-30.4 ; -26.3,-30.4 -26.3,34.1 26.3,34.1 26.3,-30.4 -26.3,-30.4
3D body "User Library-Keypad 3x4.step": height 22.8, standoff 0, extent -26.175,-35.8 26.176,33.95
3D body "PIN_mid.STEP": height 8.43, standoff -2.49, extent -1.29,-34.156 1.25,-31.616
3D body "PIN.STEP": height 8.43, standoff -2.49, extent -8.91,-34.156 -6.37,-31.616
3D body "PIN_mid.STEP": height 8.43, standoff -2.49, extent -6.37,-34.156 -3.83,-31.616
3D body "PIN_mid.STEP": height 8.43, standoff -2.49, extent -3.83,-34.156 -1.29,-31.616
3D body "PIN_mid.STEP": height 8.43, standoff -2.49, extent 1.25,-34.156 3.79,-31.616
3D body "PIN_mid.STEP": height 8.43, standoff -2.49, extent 3.79,-34.156 6.33,-31.616
3D body "PIN.STEP": height 8.43, standoff -2.49, extent 6.33,-34.156 8.87,-31.616

## KEYPAD4X4_9T [mm] "Matrix Keyboard 4x4"
pads (13):
  oval 1.6x2.4 hole 1: C1(-7.56,26.9) C2(-5.02,26.9) C3(-2.48,26.9) C4(0.06,26.9) R1(2.6,26.9) R2(5.14,26.9) R3(7.68,26.9) R4(10.22,26.9) V(-10.1,26.9)
  round 3.5 / inner round 3.5 / far side round 5.5 hole 3.2: ""(-30,-29.5) ""(-30,29.5) ""(30,-29.5) ""(30,29.5)
Top Overlay:
  lines w0.2: -32.6,-32.1 -32.6,32.1 32.6,32.1 32.6,-32.1 -32.6,-32.1
3D body "43128.stp": height 15.25, standoff -5.62, extent -32.5,-32 32.5,32